# Altium footprint library Mine.PcbLib: 306 footprints (part 16 of 20)
Each footprint in its own frame and in the unit in brackets; x right, y up, seen from the top. Pads: shape width x height; smd on the part's side, far side on the other; paste and mask are expansions set on the pad; w line width, h text height; cw(c..) or ccw(c..) is an arc to the next point about the centre after c.
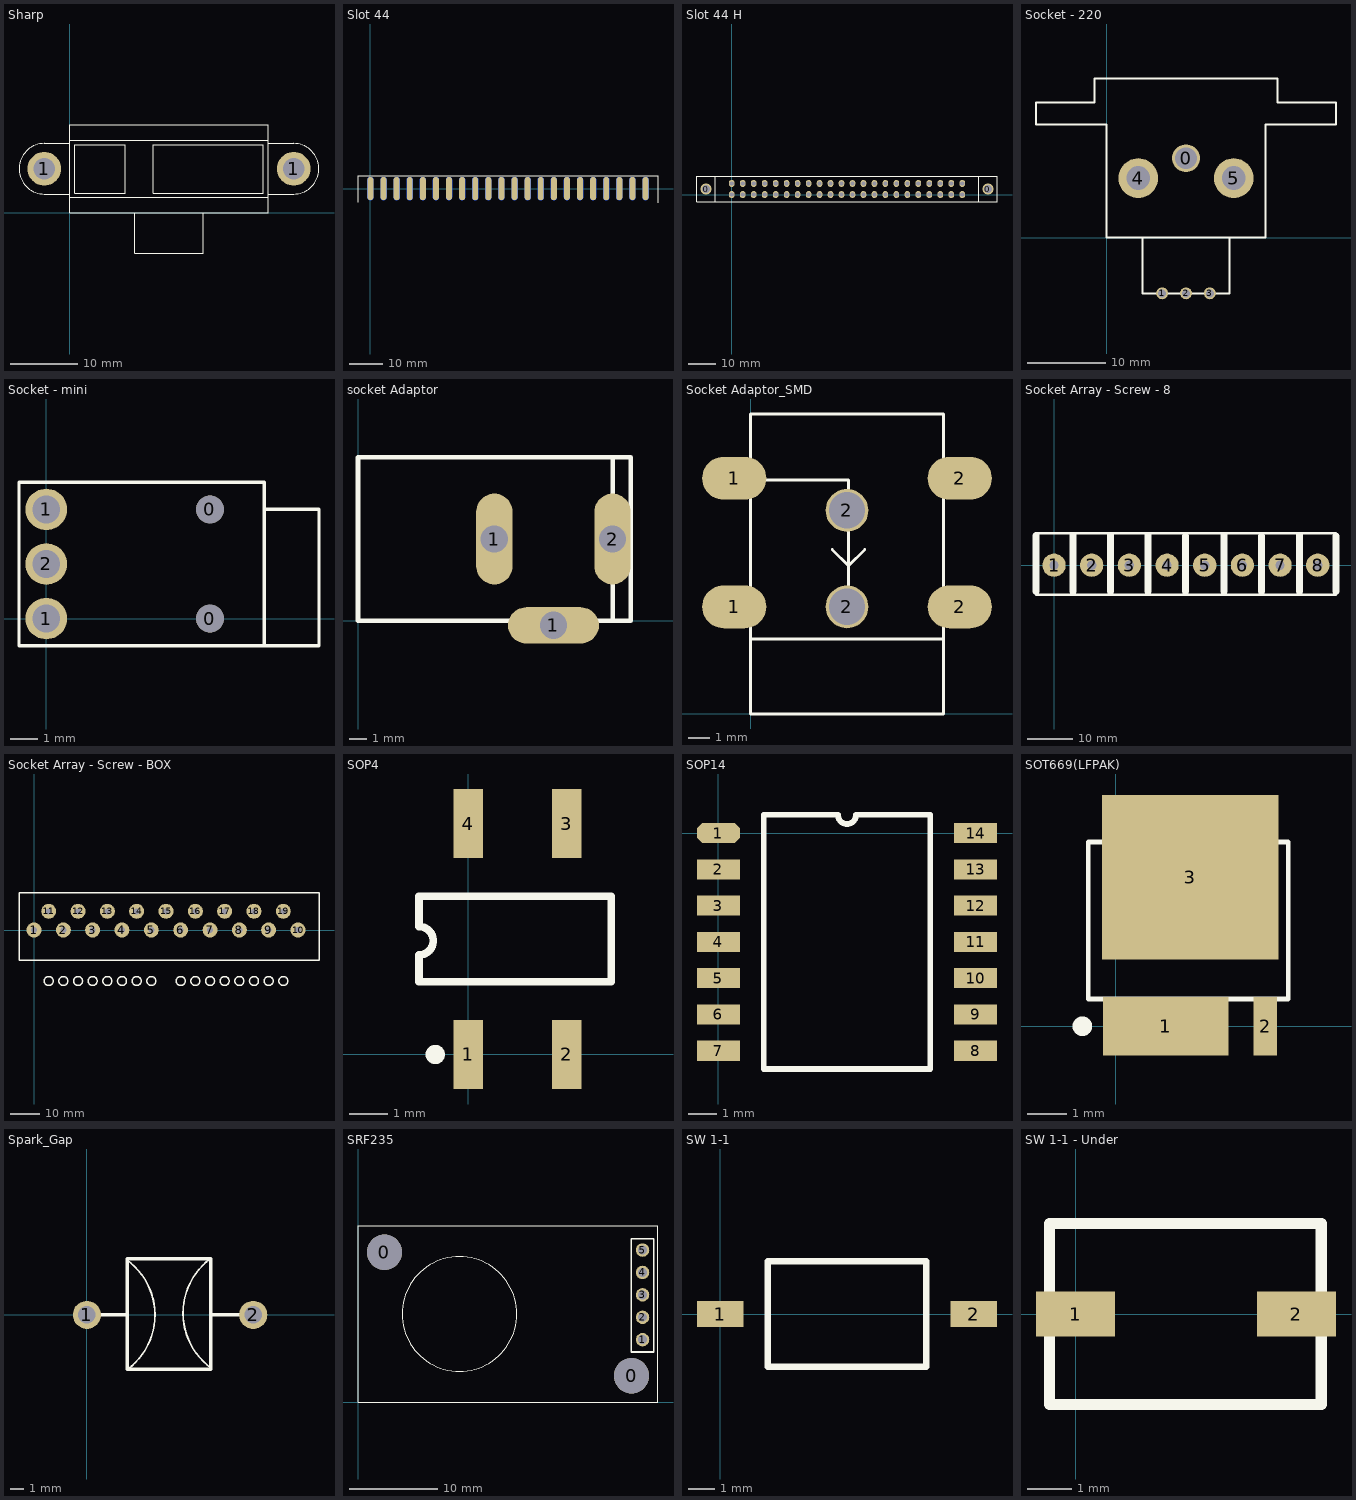
[diagram p15: the footprints below, top view; thin cyan lines are the x and y axes]

## Sharp [mm]
height 13.5
pads (2):
  round 5 hole 3.2: 1(-3.75,6.5) 1(33.25,6.5)
Top Overlay:
  lines w0.127: 0,2.3 29.5,2.3 ; 0,2.75 -3.75,2.75 cw(c-3.75,6.5) -3.75,10.25 0,10.25 ; 0,10.7 29.5,10.7 ; 9.7,0 9.7,-6 19.8,-6 19.8,0 ; 29.5,2.75 33.25,2.75 ccw(c33.25,6.5) 33.25,10.25 29.5,10.25 ; 0,0 0,13 29.5,13 29.5,0 0,0 ; 0.75,2.9 8.25,2.9 8.25,10.1 0.75,10.1 0.75,2.9 ; 12.4,2.9 12.4,10.1 28.7,10.1 28.7,2.9 12.4,2.9

## Slot 44 [mm]
pads (44):
  oval 1.8x7 smd far side: 1(0,0) 3(3.952,0) 5(7.905,0) 7(11.857,0) 9(15.81,0) 11(19.762,0) 13(23.714,0) 15(27.667,0) 17(31.619,0) 19(35.571,0) 21(39.524,0) 23(43.476,0) 25(47.429,0) 27(51.381,0) 29(55.333,0) 31(59.286,0) 33(63.238,0) 35(67.19,0) 37(71.143,0) 39(75.095,0) 41(79.048,0) 43(83,0)
  oval 1.8x7 smd: 2(0,0) 4(3.952,0) 6(7.905,0) 8(11.857,0) 10(15.81,0) 12(19.762,0) 14(23.714,0) 16(27.667,0) 18(31.619,0) 20(35.571,0) 22(39.524,0) 24(43.476,0) 26(47.429,0) 28(51.381,0) 30(55.333,0) 32(59.286,0) 34(63.238,0) 36(67.19,0) 38(71.143,0) 40(75.095,0) 42(79.048,0) 44(83,0)
Top Overlay:
  lines w0.127: -3.75,-4.064 -3.75,3.81 82.804,3.81 86.75,3.81 86.75,-4.064 86.741,-4.064

## Slot 44 H [mil]
height 590.55
pads (46):
  round 157.48 hole 118.11: 0(-364.17,78.74) 0(3631.89,78.74)
  oval 80x100 hole 60: 1(0,0) 2(0,157.48) 3(155.61,0) 4(155.61,157.48) 5(311.21,0) 6(311.21,157.48) 7(466.82,0) 8(466.82,157.48) 9(622.42,0) 10(622.42,157.48) 11(778.03,0) 12(778.03,157.48) 13(933.63,0) 14(933.63,157.48) 15(1089.24,0) 16(1089.24,157.48) 17(1244.84,0) 18(1244.84,157.48) 19(1400.45,0) 20(1400.45,157.48) 21(1556.06,0) 22(1556.06,157.48) 23(1711.66,0) 24(1711.66,157.48) 25(1867.27,0) 26(1867.27,157.48) 27(2022.87,0) 28(2022.87,157.48) 29(2178.48,0) 30(2178.48,157.48) 31(2334.08,0) 32(2334.08,157.48) 33(2489.69,0) 34(2489.69,157.48) 35(2645.29,0) 36(2645.29,157.48) 37(2800.9,0) 38(2800.9,157.48) 39(2956.51,0) 40(2956.51,157.48) 41(3112.11,0) 42(3112.11,157.48) 43(3267.72,0) 44(3267.72,157.48)
Top Overlay:
  lines w5: 3503.94,-98.43 3503.94,255.91 ; -236.22,-98.43 -236.22,255.91 ; -236.22,-98.43 3759.84,-98.43 3759.84,255.91 -236.22,255.91 ; -236.22,-98.43 -492.13,-98.43 -492.13,255.91 -236.22,255.91
3D body: height 438.36, standoff -129.64, extent -503,-82.5 3775,242.5

## Socket - 220 [mil]
pads (6):
  round 140 hole 110: 0(400,400)
  round 60 hole 40: 1(280,-280) 2(400,-280) 3(520,-280)
  round 200 hole 120: 4(160,300) 5(640,300)
Top Overlay:
  lines w10: 180,0 180,-280 620,-280 620,0 ; -355,570 0,570 0,0 800,0 800,570 1155,570 1155,680 860,680 860,800 -60,800 -60,680 -355,680 -355,570

## Socket - mini [mil]
height 196.85
pads (5):
  round 40 hole 40: 0(236.22,0) 0(236.22,157.48)
  round 60 hole 40: 1(0,0) 1(0,157.48) 2(0,78.74)
Top Overlay:
  lines w5: 314.96,157.48 393.7,157.48 393.7,-39.37 314.96,-39.37 ; 314.96,-39.37 -39.37,-39.37 -39.37,196.85 314.96,196.85 314.96,-39.37

## socket Adaptor [mil]
pads (3):
  oval 80x200 hole 60: 1(300,180) 2(560,180)
  oval 200x80 hole 60: 1(430,-10)
Top Overlay:
  lines w10: 560,0 560,360 ; 0,0 0,360 600,360 600,0 0,0

## Socket Adaptor_SMD [mm]
height 11
pads (6):
  oval 3x2 smd: 1(-0.762,5) 1(-0.762,11) 2(9.762,5) 2(9.762,11)
  round 2 hole 1.7: 2(4.5,5) 2(4.5,9.5)
Top Overlay:
  lines w0.127: 0,3.5 9,3.5 ; 0,10.922 4.572,10.922 4.572,5.08 ; 3.81,7.68 4.572,6.918 5.334,7.68 ; 0,0 0,14 9,14 9,0 0,0

## Socket Array - Screw - 8 [mil]
pads (8):
  round 200 hole 80: 1(0,0) 2(324,0) 3(648,0) 4(972,0) 5(1296,0) 6(1620,0) 7(1944,0) 8(2268,0)
Top Overlay:
  lines w20: -155,-255 2425,-255 ; -155,275 2425,275
  lines w60: -155,-225 -155,255 ; 485,-225 485,255 ; 810,-225 810,255 ; 1130,-225 1130,250 ; 1460,-225 1460,255 ; 1785,-225 1785,250 ; 2110,-225 2110,255 ; 2425,-225 2425,250 ; 165,-225 165,255 165,-225

## Socket Array - Screw - BOX [mil]
pads (19):
  round 200 hole 80: 1(0,0) 2(391,0) 3(782,0) 4(1173,0) 5(1564,0) 6(1956,0) 7(2347,0) 8(2738,0) 9(3129,0) 10(3520,0) 11(196,250) 12(587,250) 13(978,250) 14(1369,250) 15(1760,250) 16(2151,250) 17(2542,250) 18(2933,250) 19(3324,250)
Top Overlay:
  circle w20: c1369,-680 r60
  circle w20: c1564,-680 r60
  circle w20: c196,-680 r60
  circle w20: c978,-680 r60
  circle w20: c587,-680 r60
  circle w20: c1173,-680 r60
  circle w20: c782,-680 r60
  circle w20: c391,-680 r60
  circle w20: c2738,-680 r60
  circle w20: c2933,-680 r60
  circle w20: c2347,-680 r60
  circle w20: c1956,-680 r60
  circle w20: c2542,-680 r60
  circle w20: c2151,-680 r60
  circle w20: c3129,-680 r60
  circle w20: c3324,-680 r60
  lines w20: -200,-400 -200,500 3800,500 3800,-400 -200,-400

## SOP4 [mil]
height 39.37
pads (4):
  rect 30x70 smd: 1(0,0) 2(100,0) 3(100,234.25) 4(0,234.25)
Top Overlay:
  circle w9.84: c-33.46,0 r4.92
  lines w7.87: -50,99.76 -50,73.82 145,73.82 145,160.43 -50,160.43 -50,129.76 cw(c-50,115.33) -50,100.89
3D body: height 86.61, standoff 7.87, extent -38.23,31.77 135,205

## SOP14 [mm]
height 5.5
pads (14):
  oct 1.5x0.7 smd: 1(0,0)
  rect 1.5x0.7 smd: 2(0,-1.27) 3(0,-2.54) 4(0,-3.81) 5(0,-5.08) 6(0,-6.35) 7(0,-7.62) 8(9,-7.62) 9(9,-6.35) 10(9,-5.08) 11(9,-3.81) 12(9,-2.54) 13(9,-1.27) 14(9,0)
Top Overlay:
  lines w0.2: 1.585,-8.255 7.415,-8.255 7.415,0.635 4.817,0.635 cw(c4.5,0.635) 4.182,0.635 1.585,0.635 1.585,-8.255

## SOT669(LFPAK) [mm]
height 1.2
pads (3):
  rect 3.2x1.5 smd: 1(1.27,0)
  rect 0.6x1.5 smd: 2(3.81,0)
  rect 4.5x4.2 smd: 3(1.9,3.8)
Top Overlay:
  circle w0.25: c-0.85,0 r0.125
  lines w0.127: -0.7,0.7 -0.7,4.7 4.4,4.7 4.4,0.7 -0.7,0.7

## Spark_Gap [mil]
height 314.96
pads (2):
  round 80 hole 50: 1(0,0) 2(472.44,0)
Top Overlay:
  lines w5: 112.66,156.71 cw(c0,0) 115,-155 ; 351.22,159.96 ccw(c466.22,4.96) 353.56,-151.75
  lines w10: 0,0 115,0 ; 357.44,0 472.44,0 ; 115,-155 351.22,-155 351.22,159.96 115,159.96 115,-155

## SRF235 [mm]
height 20
pads (7):
  round 4 hole 4: 0(3,17) 0(31,3)
  round 1.524 hole 1.016: 1(32.25,7.09) 2(32.25,9.63) 3(32.25,12.17) 4(32.25,14.71) 5(32.25,17.25)
Top Overlay:
  circle w0.127: c11.5,10 r6.5
  lines w0.127: 0,20 34,19.975 34,0 0,0 0.025,19.975
  lines w0.2: 30.98,5.68 33.52,5.68 33.52,18.52 30.98,18.52 30.98,5.68

## SW 1-1 [mil]
pads (2):
  rect 70x40 smd: 1(0,0) 2(384,0)
Top Overlay:
  lines w10: 72,-80 72,80 312,80 312,-80 72,-80

## SW 1-1 - Under [mil]
pads (2):
  rect 70x40 smd: 1(0,0) 2(195,0)
Top Overlay:
  lines w10: -23,-80 217,-80 217,80 -23,80 -23,-80